# Altium footprint library bldc.PcbLib: 62 footprints (part 1 of 4)
Each footprint in its own frame and in the unit in brackets; x right, y up, seen from the top. Pads: shape width x height; smd on the part's side, far side on the other; paste and mask are expansions set on the pad; w line width, h text height; cw(c..) or ccw(c..) is an arc to the next point about the centre after c.
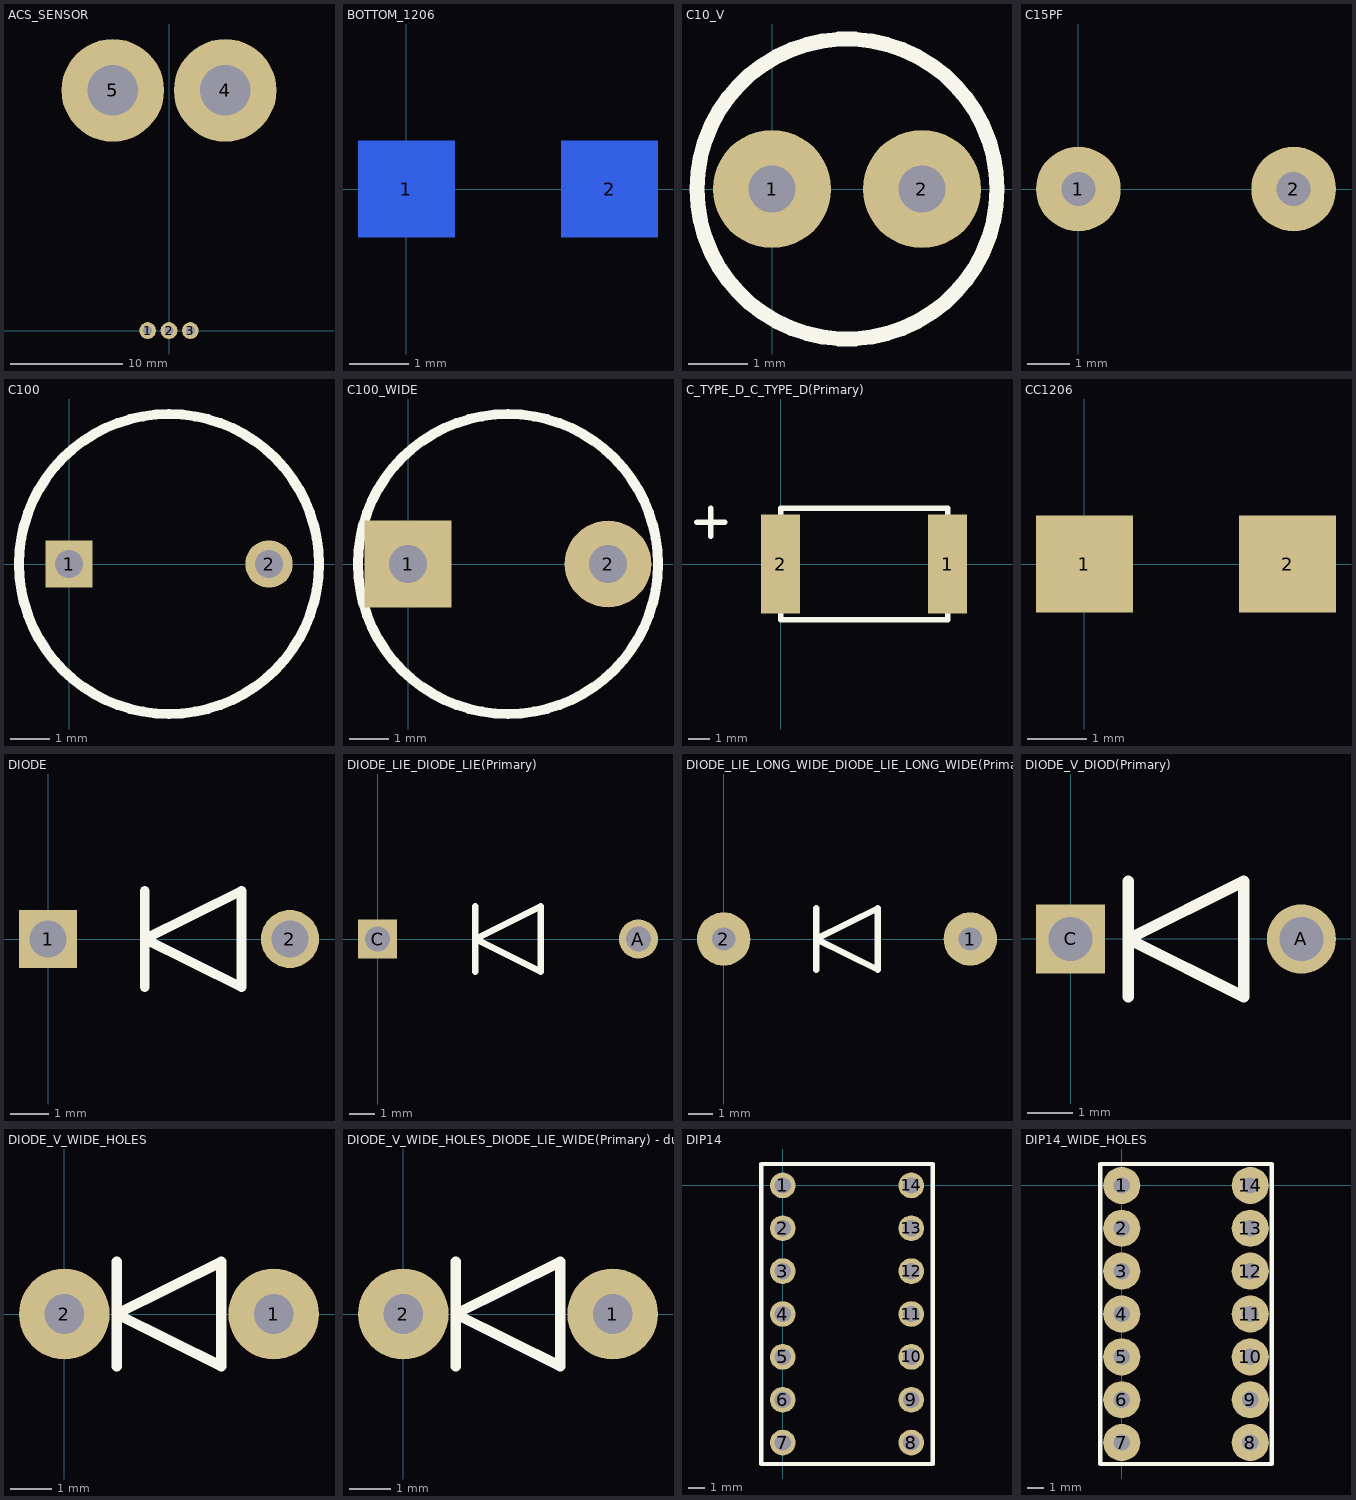
[diagram p0: the footprints below, top view; thin cyan lines are the x and y axes]

## ACS_SENSOR [mil]
pads (5):
  round 59 hole 31.5: 1(-75,0) 2(0,0) 3(75,0)
  round 360 hole 177.17: 4(197,842) 5(-197,842)
Multi-Layer:
  lines w3.94: -275,802 cw(c-275,842) -275,882 ; -118,802 ccw(c-118,842) -118,882 ; 118,802 cw(c118,842) 118,882 ; 275,802 ccw(c275,842) 275,882
  lines w4: -275,802 -118,802 ; -275,882 -118,882 ; 118,802 275,802 ; 118,882 275,882
3D body "ACS758.STEP": height 275.59, standoff -137.8, extent -275.59,-10 275.59,869.92

## BOTTOM_1206 [mil]
pads (2):
  rect 64.02x64.02 smd far side: 1(0,0) 2(134,0)

## C10_V [mm]
pads (2):
  round 2 hole 0.8 unplated: 1(0,0) 2(2.54,0)
Top Overlay:
  circle w0.254: c1.27,0 r2.54
3D body "CAPPR250-500X1100.stp": height 10.9, standoff -3.6, extent -1.262,-2.512 3.738,2.488

## C15PF [mm]
pads (2):
  round 2 hole 0.8 unplated: 1(0,0) 2(5.08,0)

## C100 [mm]
pads (2):
  rect 1.2x1.2 hole 0.7: 1(0,0)
  round 1.2 hole 0.7: 2(5.08,0)
Top Overlay:
  lines w0.254: -1.27,0 ccw(c2.54,0) 6.35,0 ccw(c2.54,0) -1.27,0
3D body "CAPPR500-1000X1250.stp": height 12.5, standoff -3.6, extent -2.51,-5.01 7.49,4.956

## C100_WIDE [mm]
pads (2):
  rect 2.2x2.2 hole 0.965: 1(0,0)
  round 2.2 hole 0.965: 2(5.08,0)
Top Overlay:
  lines w0.254: -1.27,0 cw(c2.54,0) 6.35,0 cw(c2.54,0) -1.27,0
3D body "CAPPR500-1000X1250.stp": height 12.5, standoff -3.6, extent -2.51,-5.01 7.49,4.956

## C_TYPE_D_C_TYPE_D(Primary) [mm]
pads (2):
  rect 1.778x4.5 smd: 1(7.62,0) 2(0,0)
Top Overlay:
  lines w0.254: -3.81,1.905 -2.54,1.905 ; -3.175,1.27 -3.175,2.54 ; 0,-2.54 0,2.54 7.62,2.54 7.62,-2.54 0,-2.54

## CC1206 [mil]
pads (2):
  rect 64x64 smd: 1(0,0) 2(134,0)
3D body "SW3dPS-1206 SMD Capacitor.STEP": height 39.45, standoff 0, extent 8.02,-31.5 134,31.5

## DIODE [mil]
pads (2):
  rect 60x60 hole 37.99: 1(0,0)
  round 60 hole 37.99: 2(250,0)
Top Overlay:
  lines w10: 100,-50 100,50 ; 100,0 200,50 200,-50 100,0

## DIODE_LIE_DIODE_LIE(Primary) [mil]
pads (2):
  round 60 hole 37.99: A(400,0)
  rect 60x60 hole 37.99: C(0,0)
Top Overlay:
  lines w10: 150,-50 150,50 ; 150,0 250,50 250,-50 150,0

## DIODE_LIE_LONG_WIDE_DIODE_LIE_LONG_WIDE(Primary) [mm]
pads (2):
  round 2.2 hole 0.965: 1(10.16,0) 2(0,0)
Top Overlay:
  lines w0.254: 3.81,-1.27 3.81,1.27 ; 3.81,0 6.35,1.27 6.35,-1.27 3.81,0

## DIODE_V_DIOD(Primary) [mil]
pads (2):
  round 60 hole 37.99: A(200,0)
  rect 60x60 hole 37.99: C(0,0)
Top Overlay:
  lines w10: 50,-50 50,50 ; 50,0 150,50 150,-50 50,0

## DIODE_V_WIDE_HOLES [mm]
pads (2):
  round 2.2 hole 0.965: 1(5.08,0) 2(0,0)
Top Overlay:
  lines w0.254: 1.27,-1.27 1.27,1.27 ; 1.27,0 3.81,1.27 3.81,-1.27 1.27,0

## DIODE_V_WIDE_HOLES_DIODE_LIE_WIDE(Primary) - duplicate [mm]
pads (2):
  round 2.2 hole 0.965: 1(5.08,0) 2(0,0)
Top Overlay:
  lines w0.254: 1.27,-1.27 1.27,1.27 ; 1.27,0 3.81,1.27 3.81,-1.27 1.27,0

## DIP14 [mil]
pads (14):
  round 60 hole 38: 1(0,0) 2(0,-100) 3(0,-200) 4(0,-300) 5(0,-400) 6(0,-500) 7(0,-600) 8(300,-600) 9(300,-500) 10(300,-400) 11(300,-300) 12(300,-200) 13(300,-100) 14(300,0)
Top Overlay:
  lines w10: -50,-650 -50,50 350,50 350,-650 -50,-650

## DIP14_WIDE_HOLES [mm]
pads (14):
  round 2.2 hole 0.965: 1(0,0) 2(0,-2.54) 3(0,-5.08) 4(0,-7.62) 5(0,-10.16) 6(0,-12.7) 7(0,-15.24) 8(7.62,-15.24) 9(7.62,-12.7) 10(7.62,-10.16) 11(7.62,-7.62) 12(7.62,-5.08) 13(7.62,-2.54) 14(7.62,0)
Top Overlay:
  lines w0.254: -1.27,-16.51 -1.27,1.27 8.89,1.27 8.89,-16.51 -1.27,-16.51
3D body "DIP14-300.stp": height 5.33, standoff -3.3, extent -0.125,-17.465 7.745,2.225